# Altium integrated library TI Power Management Battery Management.IntLib: 950 symbols (part 32 of 48)
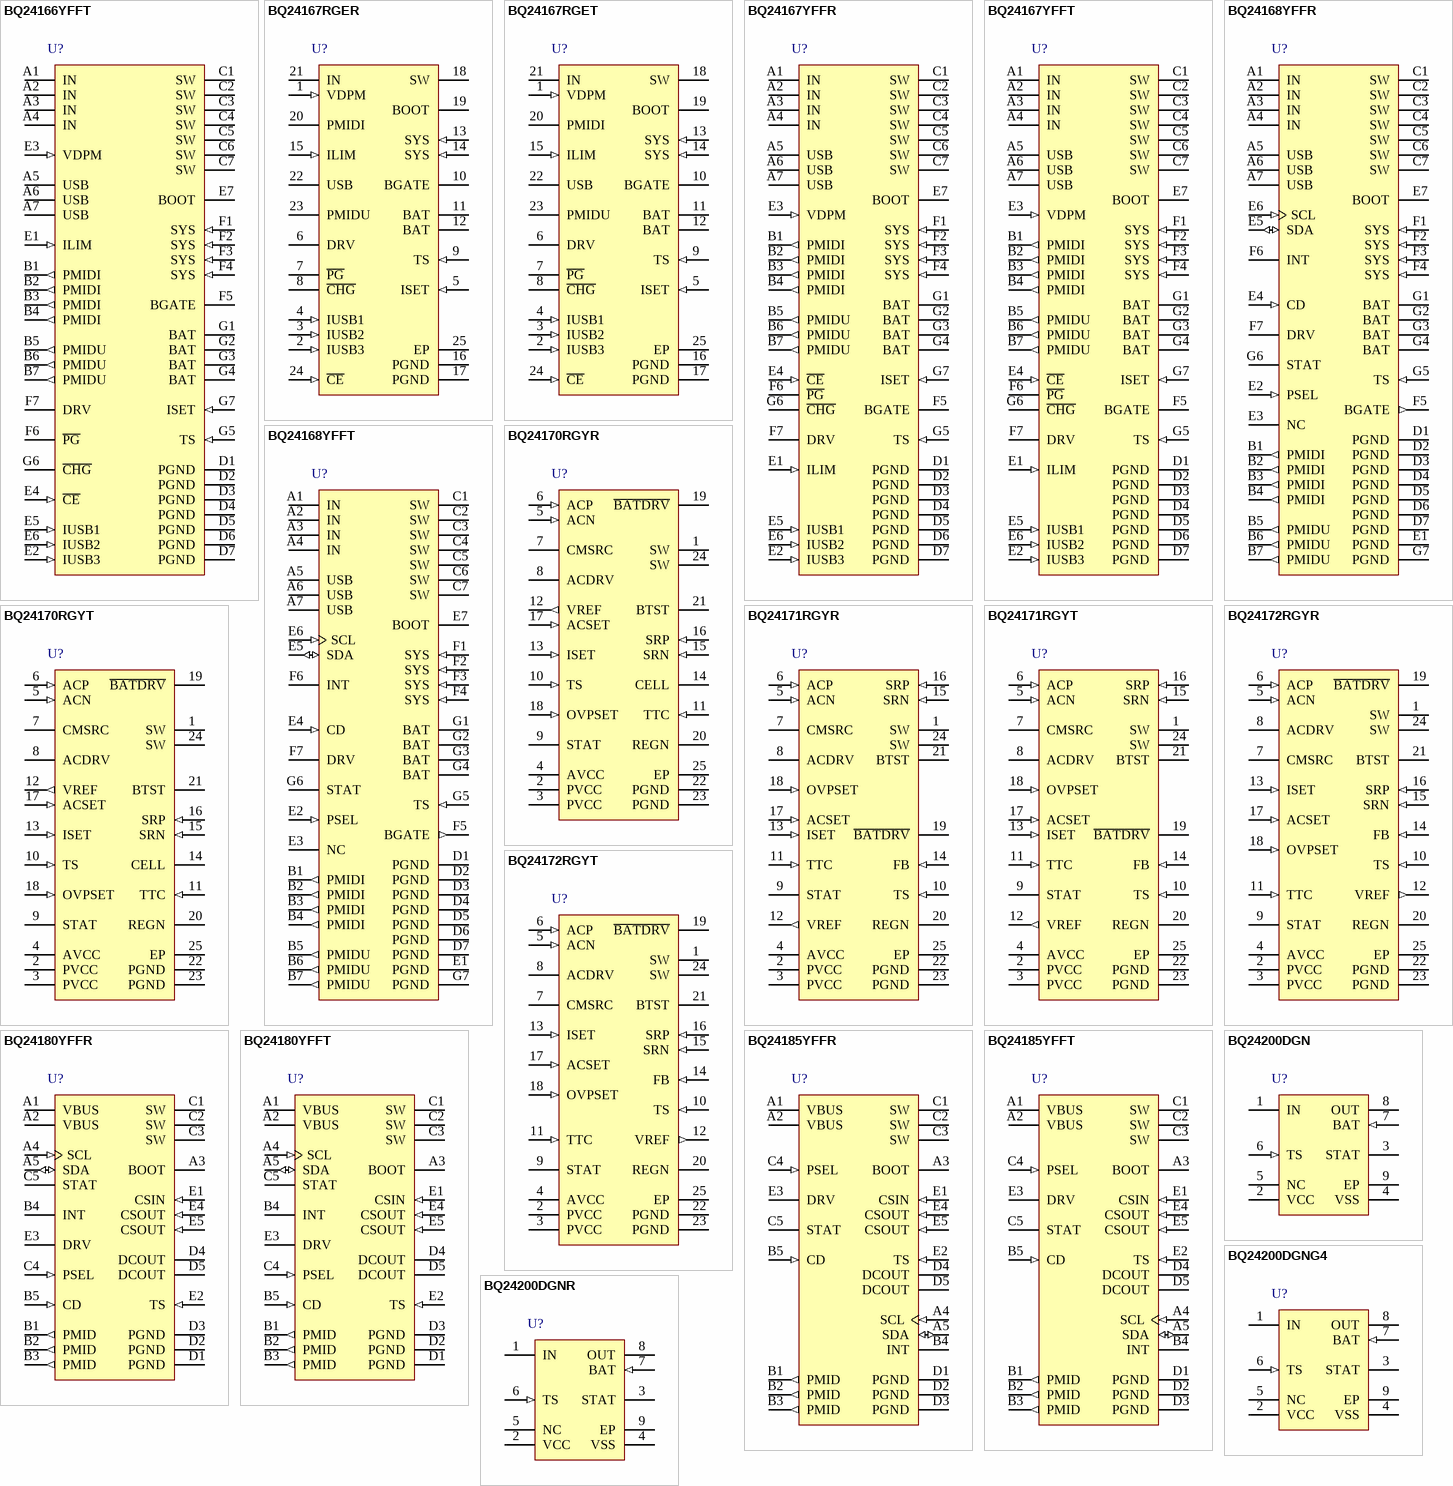
[diagram p65: symbols BQ24166YFFT to BQ24200DGNR]

## BQ24180YFFT
designator U?
Fully Integrated Switch-Mode 1-Cell Li-Ion Charger with Full USB Compliance, 4 V, 25-pin DSBGA (YFF), Green (RoHS & no Sb/Br); PartNumber: BQ24180YFFT; Manufacturer: Texas Instruments; Lead Acid: N; SubFamily: Battery Charge Management; Vin(Min)(V): 4; DatasheetVersion: SLUSA02A; PackageVersion: revAE, Nov-2011; PackageReference: YFF25-2200X2400DE; PackageDescription: 25-Ball Die-Size Ball Grid Array, 2.2 x 2.4 mm Body, 0.4 mm Pitch, Pb-Free; Supplier 1: Digi-Key; Supplier Part Number 1: 296-27177-2-ND; Supplier Part Number 3: 296-27177-6-ND; Eco-Plan: Green (RoHS & no Sb/Br); Li-Ion: N; Li-Polymer: N; NiCd: N; NiMH: N; Over Voltage Protection: N; Mounting Technology: Surface Mount; ComponentLink1Description: Datasheet; ComponentLink1URL: http://www.ti.com/general/docs/lit/getliterature.tsp?genericPartNumber=BQ24180&fileType=pdf
footprint YFF25-2200X2400DE (BGA, 25-Leads, Body 2.2x2.4mm, Pitch 0.4mm)
pins: A1 VBUS (power) "Charger Input Voltage. Connect to an input supply up to 16V. Bypass VBUS to PGND with a 1 uF ceramic capacitor. During boost mode, VBUS is regulated to 5V at up to 300mA to power USB OTG peripherals.", A2 VBUS (power) "Charger Input Voltage. Connect to an input supply up to 16V. Bypass VBUS to PGND with a 1 uF ceramic capacitor. During boost mode, VBUS is regulated to 5V at up to 300mA to power USB OTG peripherals.", A3 BOOT (power) "High-Side MOSFET Gate Driver Supply. Connect a 10nF ceramic capacitor (voltage rating above 10V) from BOOT pin to SW pin to supply the gate drive for the high side MOSFET.", A4 SCL (in) "I2C interface clock. Connect SCL to the logic rail through a 10k ohm resistor", A5 SDA (io) "I2C interface data. Connect SCL to the logic rail through a 10k ohm  resistor", B1 PMID (out) "Connection Point Between Reverse Blocking MOSFET and High-Side Switching MOSFET. Bypass PMID to PGND with a minimum of 3.3 uF ceramic capacitor. Use caution when connecting an external load to PMID. The PMID output is not (See Datasheet)", B2 PMID (out) "Connection Point Between Reverse Blocking MOSFET and High-Side Switching MOSFET. Bypass PMID to PGND with a minimum of 3.3 uF ceramic capacitor. Use caution when connecting an external load to PMID. The PMID output is not (See Datasheet)", B3 PMID (out) "Connection Point Between Reverse Blocking MOSFET and High-Side Switching MOSFET. Bypass PMID to PGND with a minimum of 3.3 uF ceramic capacitor. Use caution when connecting an external load to PMID. The PMID output is not (See Datasheet)", B4 INT (hiz) "Host Interface Status Output. INT is a low voltage open drain output used to signal charge status to the host processor. INT is pulled low during charging. When charging is complete or when charging is disabled, INT is high (See Datasheet)", B5 CD (in) "Hardware Disable Input. Connect CD to GND to enable charge. Drive CD high to disable charge and place the bq24185 into high impedance mode. Toggling CD resets the safety timer when in DEFAULT mode, but does not reset the (See Datasheet)", C1 SW (power) "Inductor Connection. Connect the switched side of the inductor to SW.", C2 SW (power) "Inductor Connection. Connect the switched side of the inductor to SW.", C3 SW (power) "Inductor Connection. Connect the switched side of the inductor to SW.", C4 PSEL (in) "USB Source Detection Input. Drive PSEL high to indicate a USB source is connected to the input and the PC mode default values should be used. When PSEL is high, the IC starts up with a 100mA input current limit. Drive PSEL (See Datasheet)", C5 STAT (hiz) "Status Output. STAT is an open drain output that is pulled low during charging. When charging is complete or when charging is disabled, STAT is high impedance. When a fault occurs, a 128µs pulse is sent out as an interrupt (See Datasheet)", D1 PGND (power) "Power ground. Connect to the ground plane for the circuit.", D2 PGND (power) "Power ground. Connect to the ground plane for the circuit.", D3 PGND (power) "Power ground. Connect to the ground plane for the circuit.", D4 DCOUT (hiz) "Accessory Power Output. DCOUT is connected to the battery through an internal pass FET. When enabled through I2C, DCOUT is connected to the battery. When disabled, DCOUT is high-impedance. Bypass DCOUT to PGND with at least (See Datasheet)", D5 DCOUT (hiz) "Accessory Power Output. DCOUT is connected to the battery through an internal pass FET. When enabled through I2C, DCOUT is connected to the battery. When disabled, DCOUT is high-impedance. Bypass DCOUT to PGND with at least (See Datasheet)", E1 CSIN (in) "Charge Current-Sense Input. Battery current is sensed via the voltage drop across an external sense resistor. Bypass CSIN to PGND with a 0.1uF ceramic capacitor.", E2 TS (in) "Battery Pack NTC Monitor. Connect TS to a 4.7kO NTC thermistor. During DEFAULT mode, when VTS >VCOLD or VTS<VHOT charging is suspended. If VHOT < VTS < VWARM charging current is reduced. The faults arereported by the I2C (See Datasheet)", E3 DRV (power) "Gate Drive Supply. DRV is the supply for the gate drive of the internal MOSFETs. Bypass DRV to PGND with a 1 uF ceramic capacitor. DRV may be used to drive external loads up to 10mA. DRV is active whenever the input is (See Datasheet)", E4 CSOUT (in) "Battery voltage and Current Sense Input. Connect to the positive terminal of the battery pack. CSOUT is also the supply for the DCOUT output and VBUS during boost mode. Bypass CSOUT to PGND with 1uF ceramic capacitor.", E5 CSOUT (in) "Battery voltage and Current Sense Input. Connect to the positive terminal of the battery pack. CSOUT is also the supply for the DCOUT output and VBUS during boost mode. Bypass CSOUT to PGND with 1uF ceramic capacitor."

## BQ24185YFFR
designator U?
Fully Integrated Switch-Mode One-Cell Li-Ion Charger with Full USB Compliance, 4 V, -40 to 85 degC, 25-pin DSBGA (YFF), Green (RoHS & no Sb/Br); PartNumber: BQ24185YFFR; Manufacturer: Texas Instruments; Lead Acid: N; SubFamily: Battery Charge Management; Vin(Min)(V): 4; DatasheetVersion: SLUSA43; PackageVersion: revAE, Nov-2011; PackageReference: YFF25-2200X2400DE; PackageDescription: 25-Ball Die-Size Ball Grid Array, 2.2 x 2.4 mm Body, 0.4 mm Pitch, Pb-Free; Supplier 1: Digi-Key; Supplier Part Number 1: 296-27956-2-ND; Supplier Part Number 3: 296-27956-6-ND; Eco-Plan: Green (RoHS & no Sb/Br); Li-Ion: N; Li-Polymer: N; NiCd: N; NiMH: N; Over Voltage Protection: N; Mounting Technology: Surface Mount; ComponentLink1Description: Datasheet; ComponentLink1URL: http://www.ti.com/general/docs/lit/getliterature.tsp?genericPartNumber=BQ24185&fileType=pdf
footprint YFF25-2200X2400DE (BGA, 25-Leads, Body 2.2x2.4mm, Pitch 0.4mm)
pins: A1 VBUS (power) "Charger Input Voltage. Connect to an input supply up to 16V. Bypass VBUS to PGND with a 1µF ceramic capacitor. During boost mode, VBUS is regulated to 5V at up to 300mA to power USB OTG peripherals.", A2 VBUS (power) "Charger Input Voltage. Connect to an input supply up to 16V. Bypass VBUS to PGND with a 1µF ceramic capacitor. During boost mode, VBUS is regulated to 5V at up to 300mA to power USB OTG peripherals.", A3 BOOT (power) "High-Side MOSFET Gate Driver Supply. Connect a 10nF ceramic capacitor (voltage rating above 10V) from BOOT pin to SW pin to supply the gate drive for the high side MOSFET.", A4 SCL (in) "I2C interface clock. Connect SCL to the logic rail through a 10kO resistor", A5 SDA (io) "I2C interface data. Connect SCL to the logic rail through a 10kO resistor", B1 PMID (out) "Connection Point Between Reverse Blocking MOSFET and High-Side Switching MOSFET. Bypass PMID to PGND with a minimum of 3.3µF ceramic capacitor. Use caution when connecting an external load to PMID. The PMID output is not (See Datasheet)", B2 PMID (out) "Connection Point Between Reverse Blocking MOSFET and High-Side Switching MOSFET. Bypass PMID to PGND with a minimum of 3.3µF ceramic capacitor. Use caution when connecting an external load to PMID. The PMID output is not (See Datasheet)", B3 PMID (out) "Connection Point Between Reverse Blocking MOSFET and High-Side Switching MOSFET. Bypass PMID to PGND with a minimum of 3.3µF ceramic capacitor. Use caution when connecting an external load to PMID. The PMID output is not (See Datasheet)", B4 INT (hiz) "Host Interface Status Output. INT is a low voltage open drain output used to signal charge status to the host processor. INT is pulled low during charging. When charging is complete or when charging is disabled, INT is high (See Datasheet)", B5 CD (in) "Hardware Disable Input. Connect CD to GND to enable charge. Drive CD high to disable charge and place the bq24185 into high impedance mode. Toggling CD resets the safety timer when in DEFAULT mode, but does not reset the (See Datasheet)", C1 SW (power) "Inductor Connection. Connect the switched side of the inductor to SW.", C2 SW (power) "Inductor Connection. Connect the switched side of the inductor to SW.", C3 SW (power) "Inductor Connection. Connect the switched side of the inductor to SW.", C4 PSEL (in) "USB Source Detection Input. Drive PSEL high to indicate a USB source is connected to the input and the PC mode default values should be used. When PSEL is high, the IC starts up with a 100mA input current limit. Drive PSEL (See Datasheet)", C5 STAT (hiz) "Status Output. STAT is an open drain output that is pulled low during charging. When charging is complete or when charging is disabled, STAT is high impedance. When a fault occurs, a 128µs pulse is sent out as an interrupt (See Datasheet)", D1 PGND (power) "Power ground. Connect to the ground plane for the circuit.", D2 PGND (power) "Power ground. Connect to the ground plane for the circuit.", D3 PGND (power) "Power ground. Connect to the ground plane for the circuit.", D4 DCOUT (power) "Accessory Power Output. DCOUT is connected to the battery through an internal pass FET. When enabled through I2C, DCOUT is connected to the battery. When disabled, DCOUT is high-impedance. Bypass DCOUT to PGND with at least (See Datasheet)", D5 DCOUT (power) "Accessory Power Output. DCOUT is connected to the battery through an internal pass FET. When enabled through I2C, DCOUT is connected to the battery. When disabled, DCOUT is high-impedance. Bypass DCOUT to PGND with at least (See Datasheet)", E1 CSIN (in) "Charge Current-Sense Input. Battery current is sensed via the voltage drop across an external sense resistor. Bypass CSIN to PGND with a 0.1µF ceramic capacitor.", E2 TS (in) "Battery Pack NTC Monitor. Connect TS to a 4.7kO NTC thermistor. During DEFAULT mode, when VTS >VCOLD or VTS<VHOT charging is suspended. If VHOT < VTS < VWARM charging current is reduced. The faults arereported by the I2C (See Datasheet)", E3 DRV (power) "Gate Drive Supply. DRV is the supply for the gate drive of the internal MOSFETs. Bypass DRV to PGND with a 1µF ceramic capacitor. DRV may be used to drive external loads up to 10mA. DRV is active whenever the input is (See Datasheet)", E4 CSOUT (in) "Battery voltage and Current Sense Input. Connect to the positive terminal of the battery pack. CSOUT is also the supply for the DCOUT output and VBUS during boost mode. Bypass CSOUT to PGND with 1µF ceramic capacitor.", E5 CSOUT (in) "Battery voltage and Current Sense Input. Connect to the positive terminal of the battery pack. CSOUT is also the supply for the DCOUT output and VBUS during boost mode. Bypass CSOUT to PGND with 1µF ceramic capacitor."

## BQ24185YFFT
designator U?
Fully Integrated Switch-Mode One-Cell Li-Ion Charger with Full USB Compliance, 4 V, -40 to 85 degC, 25-pin DSBGA (YFF), Green (RoHS & no Sb/Br); PartNumber: BQ24185YFFT; Manufacturer: Texas Instruments; Lead Acid: N; SubFamily: Battery Charge Management; Vin(Min)(V): 4; DatasheetVersion: SLUSA43; PackageVersion: revAE, Nov-2011; PackageReference: YFF25-2200X2400DE; PackageDescription: 25-Ball Die-Size Ball Grid Array, 2.2 x 2.4 mm Body, 0.4 mm Pitch, Pb-Free; Supplier 1: Digi-Key; Supplier Part Number 1: BQ24185YFFT-ND; Supplier Part Number 3: 595-BQ24185YFFT; Eco-Plan: Green (RoHS & no Sb/Br); Li-Ion: N; Li-Polymer: N; NiCd: N; NiMH: N; Over Voltage Protection: N; Mounting Technology: Surface Mount; ComponentLink1Description: Datasheet; ComponentLink1URL: http://www.ti.com/general/docs/lit/getliterature.tsp?genericPartNumber=BQ24185&fileType=pdf
footprint YFF25-2200X2400DE (BGA, 25-Leads, Body 2.2x2.4mm, Pitch 0.4mm)
pins: A1 VBUS (power) "Charger Input Voltage. Connect to an input supply up to 16V. Bypass VBUS to PGND with a 1µF ceramic capacitor. During boost mode, VBUS is regulated to 5V at up to 300mA to power USB OTG peripherals.", A2 VBUS (power) "Charger Input Voltage. Connect to an input supply up to 16V. Bypass VBUS to PGND with a 1µF ceramic capacitor. During boost mode, VBUS is regulated to 5V at up to 300mA to power USB OTG peripherals.", A3 BOOT (power) "High-Side MOSFET Gate Driver Supply. Connect a 10nF ceramic capacitor (voltage rating above 10V) from BOOT pin to SW pin to supply the gate drive for the high side MOSFET.", A4 SCL (in) "I2C interface clock. Connect SCL to the logic rail through a 10kO resistor", A5 SDA (io) "I2C interface data. Connect SCL to the logic rail through a 10kO resistor", B1 PMID (out) "Connection Point Between Reverse Blocking MOSFET and High-Side Switching MOSFET. Bypass PMID to PGND with a minimum of 3.3µF ceramic capacitor. Use caution when connecting an external load to PMID. The PMID output is not (See Datasheet)", B2 PMID (out) "Connection Point Between Reverse Blocking MOSFET and High-Side Switching MOSFET. Bypass PMID to PGND with a minimum of 3.3µF ceramic capacitor. Use caution when connecting an external load to PMID. The PMID output is not (See Datasheet)", B3 PMID (out) "Connection Point Between Reverse Blocking MOSFET and High-Side Switching MOSFET. Bypass PMID to PGND with a minimum of 3.3µF ceramic capacitor. Use caution when connecting an external load to PMID. The PMID output is not (See Datasheet)", B4 INT (hiz) "Host Interface Status Output. INT is a low voltage open drain output used to signal charge status to the host processor. INT is pulled low during charging. When charging is complete or when charging is disabled, INT is high (See Datasheet)", B5 CD (in) "Hardware Disable Input. Connect CD to GND to enable charge. Drive CD high to disable charge and place the bq24185 into high impedance mode. Toggling CD resets the safety timer when in DEFAULT mode, but does not reset the (See Datasheet)", C1 SW (power) "Inductor Connection. Connect the switched side of the inductor to SW.", C2 SW (power) "Inductor Connection. Connect the switched side of the inductor to SW.", C3 SW (power) "Inductor Connection. Connect the switched side of the inductor to SW.", C4 PSEL (in) "USB Source Detection Input. Drive PSEL high to indicate a USB source is connected to the input and the PC mode default values should be used. When PSEL is high, the IC starts up with a 100mA input current limit. Drive PSEL (See Datasheet)", C5 STAT (hiz) "Status Output. STAT is an open drain output that is pulled low during charging. When charging is complete or when charging is disabled, STAT is high impedance. When a fault occurs, a 128µs pulse is sent out as an interrupt (See Datasheet)", D1 PGND (power) "Power ground. Connect to the ground plane for the circuit.", D2 PGND (power) "Power ground. Connect to the ground plane for the circuit.", D3 PGND (power) "Power ground. Connect to the ground plane for the circuit.", D4 DCOUT (power) "Accessory Power Output. DCOUT is connected to the battery through an internal pass FET. When enabled through I2C, DCOUT is connected to the battery. When disabled, DCOUT is high-impedance. Bypass DCOUT to PGND with at least (See Datasheet)", D5 DCOUT (power) "Accessory Power Output. DCOUT is connected to the battery through an internal pass FET. When enabled through I2C, DCOUT is connected to the battery. When disabled, DCOUT is high-impedance. Bypass DCOUT to PGND with at least (See Datasheet)", E1 CSIN (in) "Charge Current-Sense Input. Battery current is sensed via the voltage drop across an external sense resistor. Bypass CSIN to PGND with a 0.1µF ceramic capacitor.", E2 TS (in) "Battery Pack NTC Monitor. Connect TS to a 4.7kO NTC thermistor. During DEFAULT mode, when VTS >VCOLD or VTS<VHOT charging is suspended. If VHOT < VTS < VWARM charging current is reduced. The faults arereported by the I2C (See Datasheet)", E3 DRV (power) "Gate Drive Supply. DRV is the supply for the gate drive of the internal MOSFETs. Bypass DRV to PGND with a 1µF ceramic capacitor. DRV may be used to drive external loads up to 10mA. DRV is active whenever the input is (See Datasheet)", E4 CSOUT (in) "Battery voltage and Current Sense Input. Connect to the positive terminal of the battery pack. CSOUT is also the supply for the DCOUT output and VBUS during boost mode. Bypass CSOUT to PGND with 1µF ceramic capacitor.", E5 CSOUT (in) "Battery voltage and Current Sense Input. Connect to the positive terminal of the battery pack. CSOUT is also the supply for the DCOUT output and VBUS during boost mode. Bypass CSOUT to PGND with 1µF ceramic capacitor."

## BQ24200DGN
designator U?
500 mA, 4.2 V Li-Ion Charger for Current-Limited App. with Temp Sense in MSOP-8, 2.8 V, -40 to 85 degC, 8-pin MSOP-PowerPAD (DGN), Green (RoHS & no Sb/Br); PartNumber: BQ24200DGN; Manufacturer: Texas Instruments; Lead Acid: N; Li-Ion: Y; SubFamily: Battery Charge Management; Vin(Min)(V): 2.8; DatasheetVersion: SLUS501C; PackageVersion: revF, May-2011; PackageReference: DGN8-1760X1425TP; PackageDescription: 8-Pin PowerPAD Plastic Small Outline Package 3 x 3 mm Body ,0.65 mm Pitch, Exposed Pad; Supplier 1: Digi-Key; Supplier Part Number 1: 296-12409-5-ND; Supplier Part Number 3: 74C7650; Eco-Plan: Green (RoHS & no Sb/Br); Li-Polymer: Y; NiCd: N; NiMH: N; Over Voltage Protection: N; Mounting Technology: Surface Mount; Code_JEDEC: MO-187-AA-T; ComponentLink1Description: Datasheet; ComponentLink1URL: http://www.ti.com/general/docs/lit/getliterature.tsp?genericPartNumber=BQ24200&fileType=pdf
footprint DGN8-1760X1425TP_N (TSOP, 8-Leads, Body 3x3mm, Pitch 0.65mm, Thermal Pad 1.89x1.57mm, IPC Medium Density)
footprint DGN8-1760X1425TP_L (TSOP, 8-Leads, Body 3x3mm, Pitch 0.65mm, Thermal Pad 1.89x1.57mm, IPC High Density)
footprint DGN8-1760X1425TP_M (TSOP, 8-Leads, Body 3x3mm, Pitch 0.65mm, Thermal Pad 1.89x1.57mm, IPC Low Density)
pins: 1 IN (power) "Charge input voltage", 2 VCC (power) "VCC input", 3 STAT (hiz) "Charge status output", 4 VSS (power) "Ground input", 5 NC "No connection. Must be left floating", 6 TS (in) "Temperature sense input", 7 BAT (in) "Battery voltage sense input", 8 OUT (power) "Charge current output", 9 EP (power) "Exposed Pad"

## BQ24200DGNG4
designator U?
500 mA, 4.2 V Li-Ion Charger for Current-Limited App. with Temp Sense in MSOP-8, 2.8 V, -40 to 85 degC, 8-pin MSOP-PowerPAD (DGN), Green (RoHS & no Sb/Br); PartNumber: BQ24200DGNG4; Manufacturer: Texas Instruments; Lead Acid: N; Li-Ion: Y; SubFamily: Battery Charge Management; Vin(Min)(V): 2.8; DatasheetVersion: SLUS501C; PackageVersion: revF, May-2011; PackageReference: DGN8-1760X1425TP; PackageDescription: 8-Pin PowerPAD Plastic Small Outline Package 3 x 3 mm Body ,0.65 mm Pitch, Exposed Pad; Supplier 1: Digi-Key; Supplier Part Number 1: BQ24200DGNG4-ND; Supplier Part Number 3: 595-BQ24200DGNG4; Eco-Plan: Green (RoHS & no Sb/Br); Li-Polymer: Y; NiCd: N; NiMH: N; Over Voltage Protection: N; Mounting Technology: Surface Mount; Code_JEDEC: MO-187-AA-T; ComponentLink1Description: Datasheet; ComponentLink1URL: http://www.ti.com/general/docs/lit/getliterature.tsp?genericPartNumber=BQ24200&fileType=pdf
footprint DGN8-1760X1425TP_N (TSOP, 8-Leads, Body 3x3mm, Pitch 0.65mm, Thermal Pad 1.89x1.57mm, IPC Medium Density)
footprint DGN8-1760X1425TP_L (TSOP, 8-Leads, Body 3x3mm, Pitch 0.65mm, Thermal Pad 1.89x1.57mm, IPC High Density)
footprint DGN8-1760X1425TP_M (TSOP, 8-Leads, Body 3x3mm, Pitch 0.65mm, Thermal Pad 1.89x1.57mm, IPC Low Density)
pins: 1 IN (power) "Charge input voltage", 2 VCC (power) "VCC input", 3 STAT (hiz) "Charge status output", 4 VSS (power) "Ground input", 5 NC "No connection. Must be left floating", 6 TS (in) "Temperature sense input", 7 BAT (in) "Battery voltage sense input", 8 OUT (power) "Charge current output", 9 EP (power) "Exposed Pad"

## BQ24200DGNR
designator U?
500 mA, 4.2 V Li-Ion Charger for Current-Limited App. with Temp Sense in MSOP-8, 2.8 V, -40 to 85 degC, 8-pin MSOP-PowerPAD (DGN), Green (RoHS & no Sb/Br); PartNumber: BQ24200DGNR; Manufacturer: Texas Instruments; Lead Acid: N; Li-Ion: Y; SubFamily: Battery Charge Management; Vin(Min)(V): 2.8; DatasheetVersion: SLUS501C; PackageVersion: revF, May-2011; PackageReference: DGN8-1760X1425TP; PackageDescription: 8-Pin PowerPAD Plastic Small Outline Package 3 x 3 mm Body ,0.65 mm Pitch, Exposed Pad; Supplier 1: Digi-Key; Supplier Part Number 1: BQ24200DGNR-ND; Supplier Part Number 3: 595-BQ24200DGNR; Eco-Plan: Green (RoHS & no Sb/Br); Li-Polymer: Y; NiCd: N; NiMH: N; Over Voltage Protection: N; Mounting Technology: Surface Mount; Code_JEDEC: MO-187-AA-T; ComponentLink1Description: Datasheet; ComponentLink1URL: http://www.ti.com/general/docs/lit/getliterature.tsp?genericPartNumber=BQ24200&fileType=pdf
footprint DGN8-1760X1425TP_N (TSOP, 8-Leads, Body 3x3mm, Pitch 0.65mm, Thermal Pad 1.89x1.57mm, IPC Medium Density)
footprint DGN8-1760X1425TP_L (TSOP, 8-Leads, Body 3x3mm, Pitch 0.65mm, Thermal Pad 1.89x1.57mm, IPC High Density)
footprint DGN8-1760X1425TP_M (TSOP, 8-Leads, Body 3x3mm, Pitch 0.65mm, Thermal Pad 1.89x1.57mm, IPC Low Density)
pins: 1 IN (power) "Charge input voltage", 2 VCC (power) "VCC input", 3 STAT (hiz) "Charge status output", 4 VSS (power) "Ground input", 5 NC "No connection. Must be left floating", 6 TS (in) "Temperature sense input", 7 BAT (in) "Battery voltage sense input", 8 OUT (power) "Charge current output", 9 EP (power) "Exposed Pad"

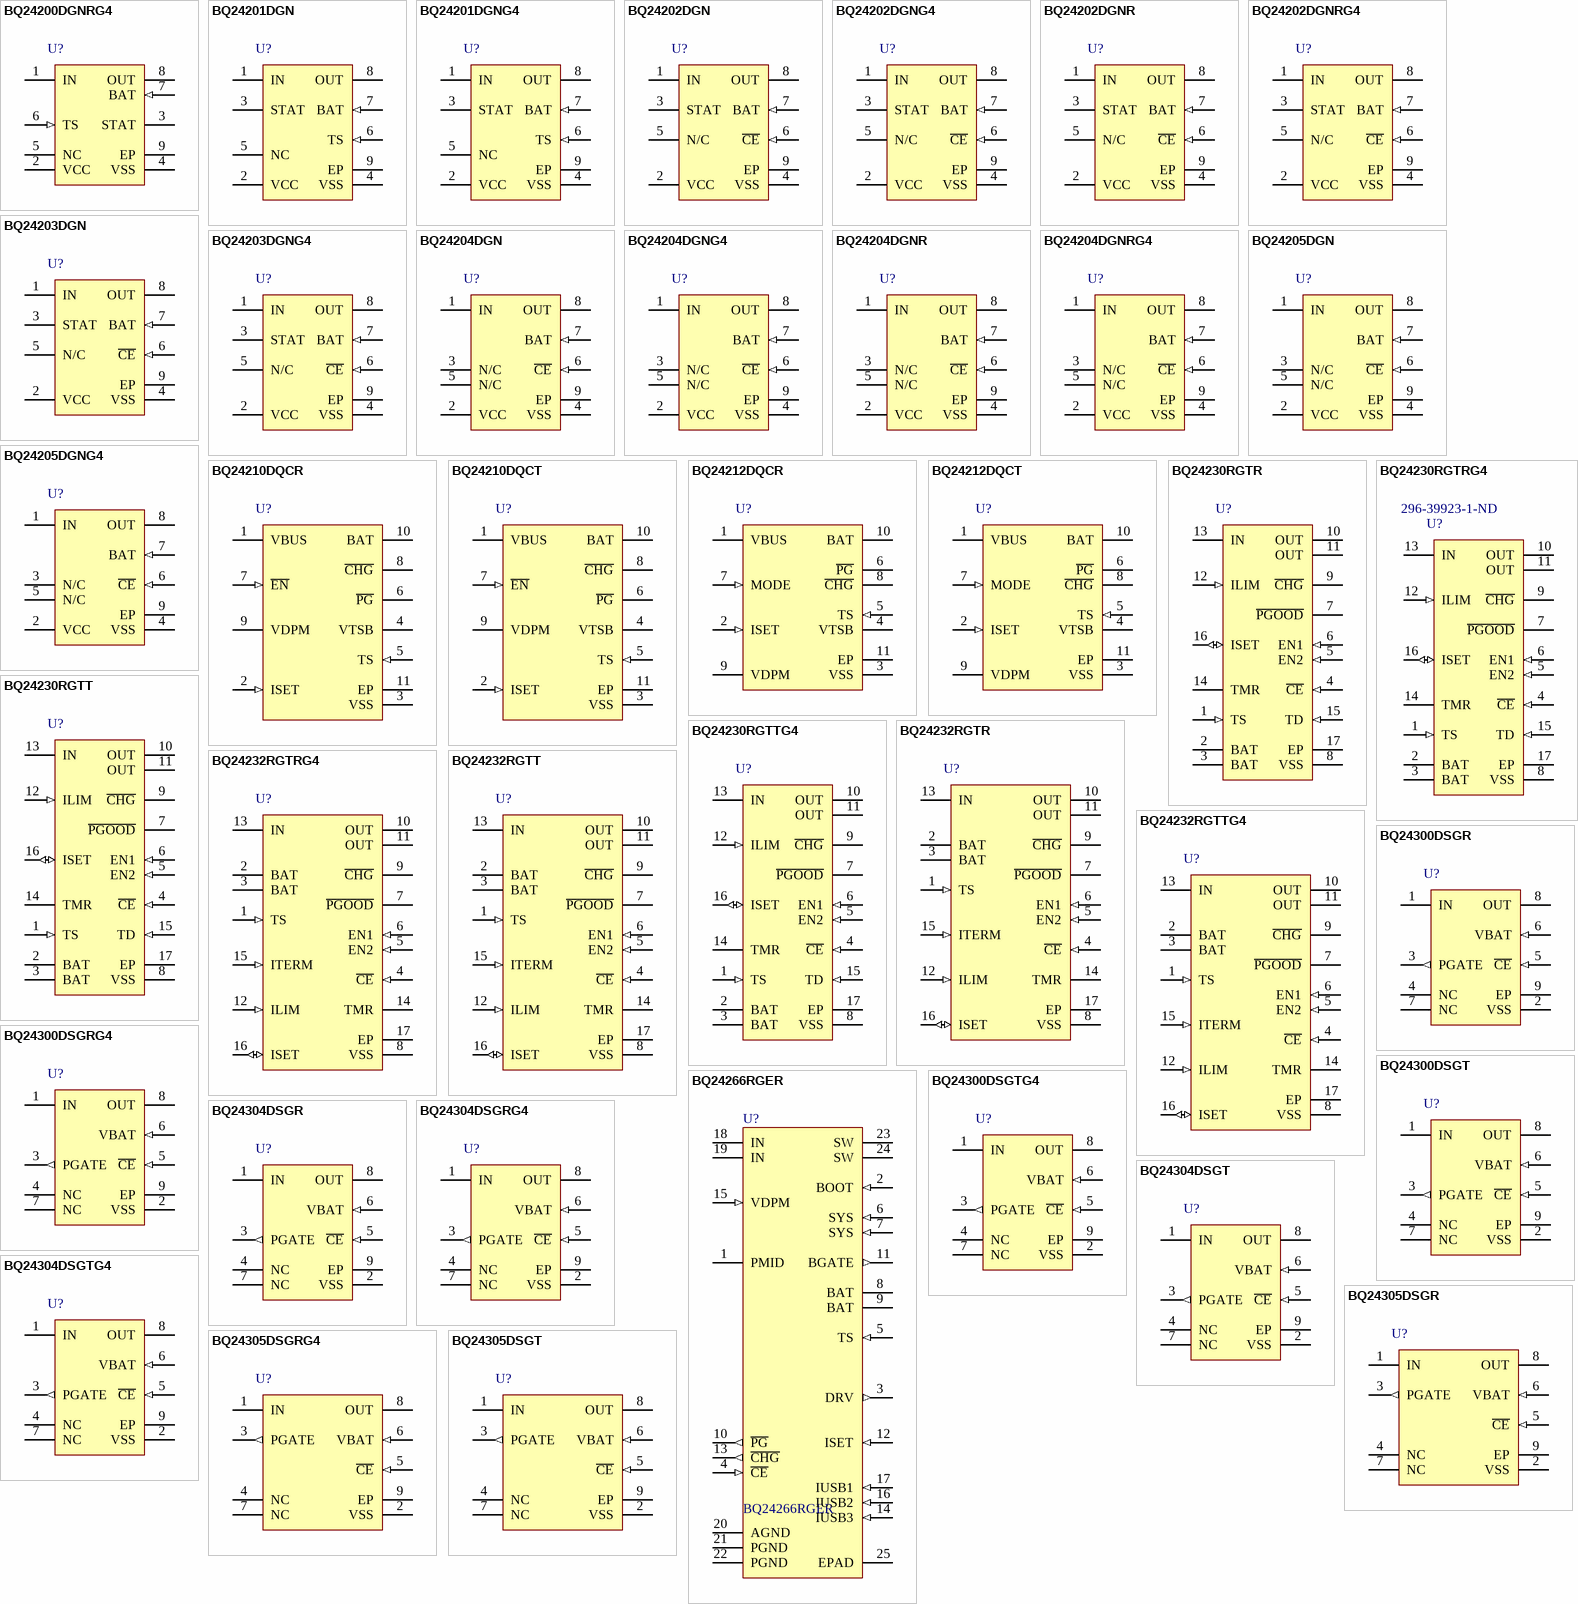
[diagram p22: symbols BQ24200DGNRG4 to BQ24305DSGT]

## BQ24200DGNRG4
designator U?
500 mA, 4.2 V Li-Ion Charger for Current-Limited App. with Temp Sense in MSOP-8, 2.8 V, -40 to 85 degC, 8-pin MSOP-PowerPAD (DGN), Green (RoHS & no Sb/Br); PartNumber: BQ24200DGNRG4; Manufacturer: Texas Instruments; Lead Acid: N; Li-Ion: Y; SubFamily: Battery Charge Management; Vin(Min)(V): 2.8; DatasheetVersion: SLUS501C; PackageVersion: revF, May-2011; PackageReference: DGN8-1760X1425TP; PackageDescription: 8-Pin PowerPAD Plastic Small Outline Package 3 x 3 mm Body ,0.65 mm Pitch, Exposed Pad; Supplier 1: Digi-Key; Supplier Part Number 1: BQ24200DGNRG4-ND; Supplier Part Number 3: 595-BQ24200DGNRG4; Eco-Plan: Green (RoHS & no Sb/Br); Li-Polymer: Y; NiCd: N; NiMH: N; Over Voltage Protection: N; Mounting Technology: Surface Mount; Code_JEDEC: MO-187-AA-T; ComponentLink1Description: Datasheet; ComponentLink1URL: http://www.ti.com/general/docs/lit/getliterature.tsp?genericPartNumber=BQ24200&fileType=pdf
footprint DGN8-1760X1425TP_N (TSOP, 8-Leads, Body 3x3mm, Pitch 0.65mm, Thermal Pad 1.89x1.57mm, IPC Medium Density)
footprint DGN8-1760X1425TP_L (TSOP, 8-Leads, Body 3x3mm, Pitch 0.65mm, Thermal Pad 1.89x1.57mm, IPC High Density)
footprint DGN8-1760X1425TP_M (TSOP, 8-Leads, Body 3x3mm, Pitch 0.65mm, Thermal Pad 1.89x1.57mm, IPC Low Density)
pins: 1 IN (power) "Charge input voltage", 2 VCC (power) "VCC input", 3 STAT (hiz) "Charge status output", 4 VSS (power) "Ground input", 5 NC "No connection. Must be left floating", 6 TS (in) "Temperature sense input", 7 BAT (in) "Battery voltage sense input", 8 OUT (power) "Charge current output", 9 EP (power) "Exposed Pad"
